# Altium footprint library B-NT_CHIPS.PcbLib: 90 footprints (part 3 of 6)
Each footprint in its own frame and in the unit in brackets; x right, y up, seen from the top. Pads: shape width x height; smd on the part's side, far side on the other; paste and mask are expansions set on the pad; w line width, h text height; cw(c..) or ccw(c..) is an arc to the next point about the centre after c.
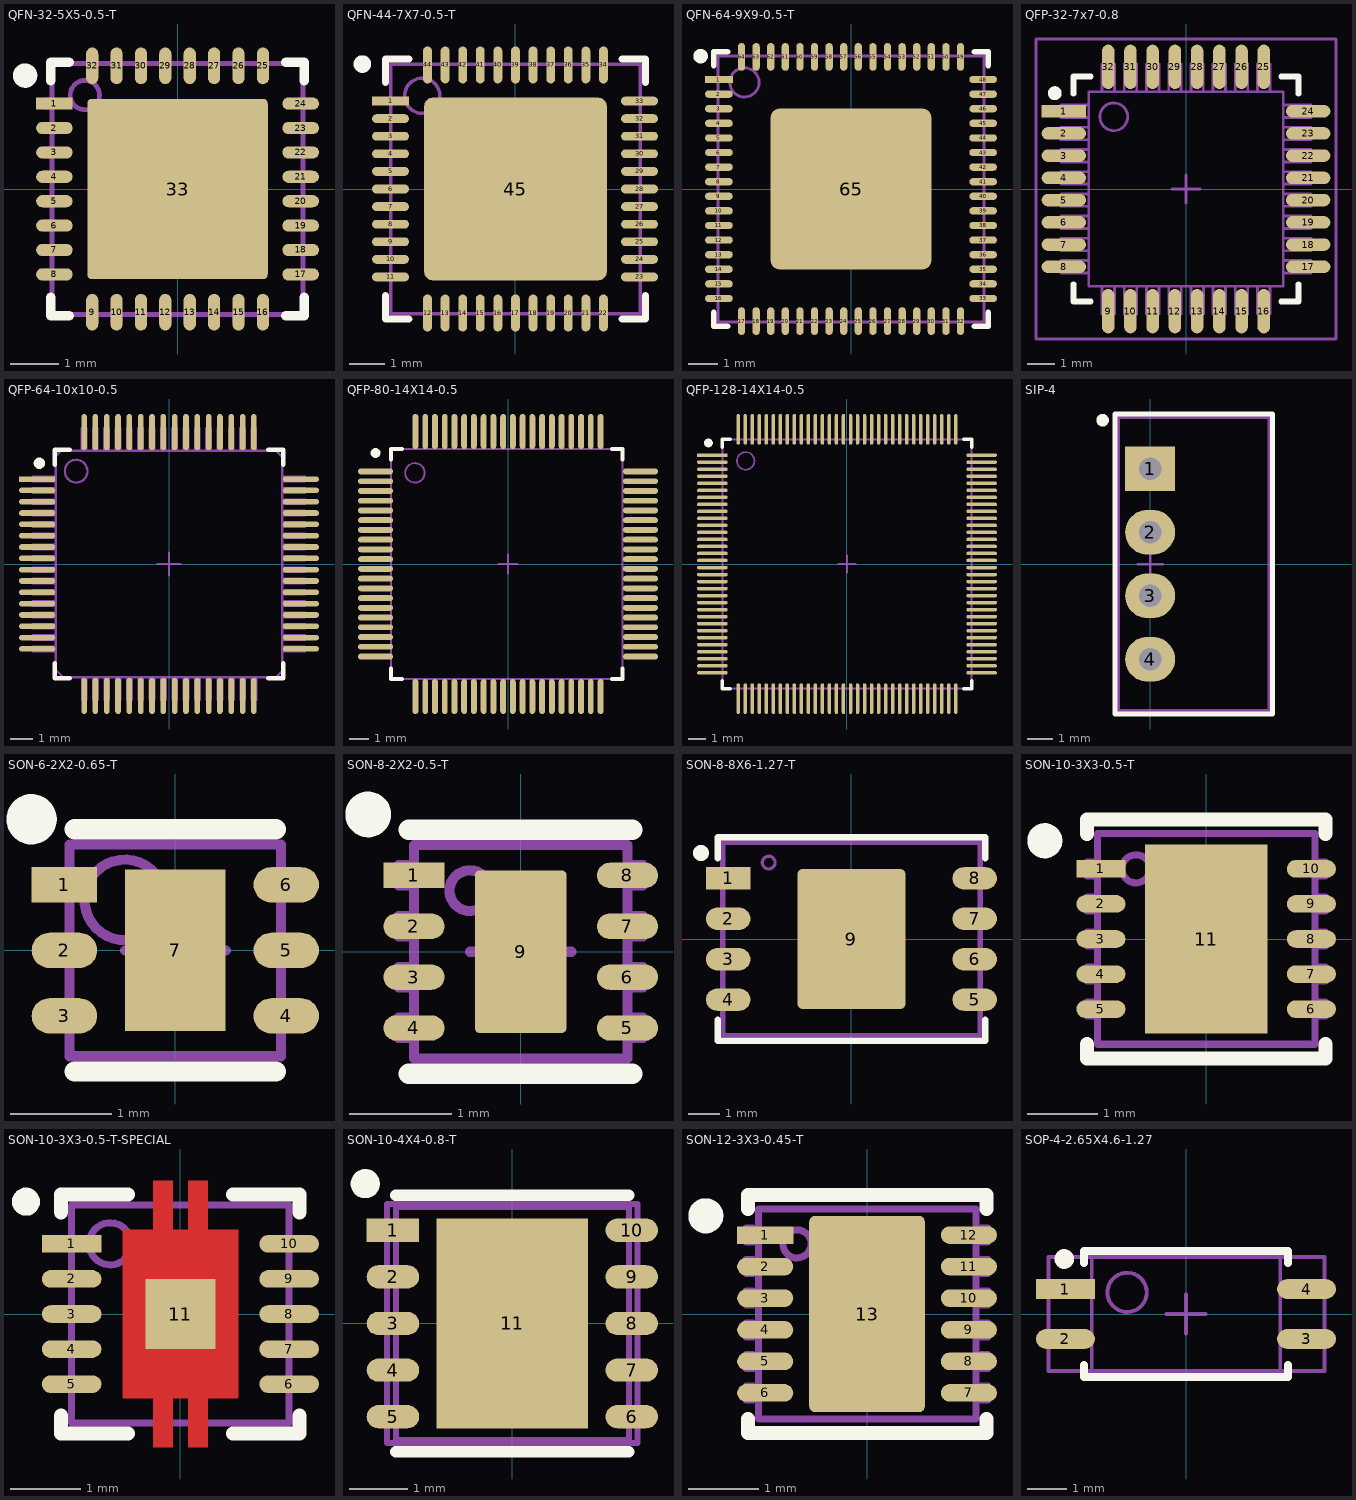
[diagram p2: the footprints below, top view; thin cyan lines are the x and y axes]

## QFN-32-5X5-0.5-T [mm] "QFN, 32-Leads with exposed die pad, Body 5.1x5.1mm (max), Pitch 0.50mm, IPC Medium Density"
height 0.8
pads (33):
  rect 0.75x0.25 smd: 1(-2.525,1.75)
  oval 0.75x0.25 smd: 2(-2.525,1.25) 3(-2.525,0.75) 4(-2.525,0.25) 5(-2.525,-0.25) 6(-2.525,-0.75) 7(-2.525,-1.25) 8(-2.525,-1.75) 17(2.525,-1.75) 18(2.525,-1.25) 19(2.525,-0.75) 20(2.525,-0.25) 21(2.525,0.25) 22(2.525,0.75) 23(2.525,1.25) 24(2.525,1.75)
  oval 0.25x0.75 smd: 9(-1.75,-2.525) 10(-1.25,-2.525) 11(-0.75,-2.525) 12(-0.25,-2.525) 13(0.25,-2.525) 14(0.75,-2.525) 15(1.25,-2.525) 16(1.75,-2.525) 25(1.75,2.525) 26(1.25,2.525) 27(0.75,2.525) 28(0.25,2.525) 29(-0.25,2.525) 30(-0.75,2.525) 31(-1.25,2.525) 32(-1.75,2.525)
  rrect5% 3.7x3.7 smd: 33(0,0)
Top Overlay:
  circle w0.25: c-3.125,2.325 r0.125
  lines w0.2: -2.6,-2.225 -2.6,-2.6 -2.225,-2.6 ; -2.6,2.225 -2.6,2.6 -2.225,2.6 ; 2.225,-2.6 2.6,-2.6 2.6,-2.225 ; 2.225,2.6 2.6,2.6 2.6,2.225
M3 Top Assy:
  circle w0.1: c-1.9,1.925 r0.3
  lines w0.1: -2.575,-1.825 -2.725,-1.825 -2.725,-1.675 -2.575,-1.675 ; -2.575,-1.325 -2.725,-1.325 -2.725,-1.175 -2.575,-1.175 ; -2.575,-0.825 -2.725,-0.825 -2.725,-0.675 -2.575,-0.675 ; -2.575,-0.325 -2.725,-0.325 -2.725,-0.175 -2.575,-0.175 ; -2.575,0.175 -2.725,0.175 -2.725,0.325 -2.575,0.325 ; -2.575,0.675 -2.725,0.675 -2.725,0.825 -2.575,0.825 ; -2.575,1.175 -2.725,1.175 -2.725,1.325 -2.575,1.325 ; -2.575,1.675 -2.725,1.675 -2.725,1.825 -2.575,1.825 ; -1.825,-2.575 -1.825,-2.725 -1.675,-2.725 -1.675,-2.575 ; -1.825,2.575 -1.825,2.725 -1.675,2.725 -1.675,2.575 ; -1.325,-2.575 -1.325,-2.725 -1.175,-2.725 -1.175,-2.575 ; -1.325,2.575 -1.325,2.725 -1.175,2.725 -1.175,2.575 ; -0.825,-2.575 -0.825,-2.725 -0.675,-2.725 -0.675,-2.575 ; -0.825,2.575 -0.825,2.725 -0.675,2.725 -0.675,2.575 ; -0.325,-2.575 -0.325,-2.725 -0.175,-2.725 -0.175,-2.575 ; -0.325,2.575 -0.325,2.725 -0.175,2.725 -0.175,2.575 ; 0.175,-2.575 0.175,-2.725 0.325,-2.725 0.325,-2.575 ; 0.175,2.575 0.175,2.725 0.325,2.725 0.325,2.575 ; 0.675,-2.575 0.675,-2.725 0.825,-2.725 0.825,-2.575 ; 0.675,2.575 0.675,2.725 0.825,2.725 0.825,2.575 ; 1.175,-2.575 1.175,-2.725 1.325,-2.725 1.325,-2.575 ; 1.175,2.575 1.175,2.725 1.325,2.725 1.325,2.575 ; 1.675,-2.575 1.675,-2.725 1.825,-2.725 1.825,-2.575 ; 1.675,2.575 1.675,2.725 1.825,2.725 1.825,2.575 ; 2.575,-1.825 2.725,-1.825 2.725,-1.675 2.575,-1.675 ; 2.575,-1.325 2.725,-1.325 2.725,-1.175 2.575,-1.175 ; 2.575,-0.825 2.725,-0.825 2.725,-0.675 2.575,-0.675 ; 2.575,-0.325 2.725,-0.325 2.725,-0.175 2.575,-0.175 ; 2.575,0.175 2.725,0.175 2.725,0.325 2.575,0.325 ; 2.575,0.675 2.725,0.675 2.725,0.825 2.575,0.825 ; 2.575,1.175 2.725,1.175 2.725,1.325 2.575,1.325 ; 2.575,1.675 2.725,1.675 2.725,1.825 2.575,1.825 ; -2.575,-2.575 2.575,-2.575 2.575,2.575 -2.575,2.575 -2.575,-2.575
M8 Top Brd Anno:
  lines w0.1: -0.5,0 0.5,0 ; 0,-0.5 0,0.5 ; -2.575,-2.575 0,-2.575 2.575,-2.575 2.575,2.575 0,2.575 -2.575,2.575 -2.575,-2.575
3D body "QFN50P500X500X80-33N.STEP": height 0.8, standoff 0, extent -2.545,-2.545 2.545,2.545

## QFN-44-7X7-0.5-T [mm] "QFN, 44-Leads, Body 7,00x7,00mm, Pitch 0,50mm, Thermal Pad 5,20x5,20mm, IPC Medium Density"
height 0.75
pads (45):
  rect 1.05x0.25 smd: 1(-3.55,2.5)
  oval 1.05x0.25 smd: 2(-3.55,2) 3(-3.55,1.5) 4(-3.55,1) 5(-3.55,0.5) 6(-3.55,0) 7(-3.55,-0.5) 8(-3.55,-1) 9(-3.55,-1.5) 10(-3.55,-2) 11(-3.55,-2.5) 23(3.525,-2.5) 24(3.525,-2) 25(3.525,-1.5) 26(3.525,-1) 27(3.525,-0.5) 28(3.525,0) 29(3.525,0.5) 30(3.525,1) 31(3.525,1.5) 32(3.525,2) 33(3.525,2.5)
  oval 0.25x1.05 smd: 12(-2.5,-3.525) 13(-2,-3.525) 14(-1.5,-3.525) 15(-1,-3.525) 16(-0.5,-3.525) 17(0,-3.525) 18(0.5,-3.525) 19(1,-3.525) 20(1.5,-3.525) 21(2,-3.525) 22(2.5,-3.525) 34(2.5,3.525) 35(2,3.525) 36(1.5,3.525) 37(1,3.525) 38(0.5,3.525) 39(0,3.525) 40(-0.5,3.525) 41(-1,3.525) 42(-1.5,3.525) 43(-2,3.525) 44(-2.5,3.525)
  rrect10% 5.2x5.2 smd: 45(0,0)
Top Overlay:
  circle w0.25: c-4.35,3.55 r0.125
  lines w0.2: -3.7,-3.025 -3.7,-3.7 -3.025,-3.7 ; -3.7,3.025 -3.7,3.7 -3.025,3.7 ; 3.025,-3.7 3.7,-3.7 3.7,-3.025 ; 3.025,3.7 3.7,3.7 3.7,3.025
Top Solder:
  rectangle: -2.7,-2.25 2.7,2.225
M3 Top Assy:
  circle w0.1: c-2.65,2.65 r0.5
  lines w0.1: -3.55,-3.55 -3.55,3.55 3.55,3.55 3.55,-3.55 -3.55,-3.55
M8 Top Brd Anno:
  lines w0.1: -0.5,0 0.5,0 ; 0,-0.5 0,0.5 ; -3.55,-3.55 -3.55,3.55 3.55,3.55 3.55,-3.55 -3.55,-3.55
Mechanical 15:
  lines w0.1: -0.5,0 0.5,0 ; 0,-0.5 0,0.5
3D body "QFN50P700X700X100_HS-45N.step": height 1, standoff 0, extent -3.57,-3.57 3.57,3.57

## QFN-64-9X9-0.5-T [mm] "QFN, 64-Leads, Body 9x9mm, Pitch 0.5mm, Thermal Pad 5.5x5.5mm, IPC Low Density"
height 1
pads (65):
  rect 0.95x0.25 smd: 1(-4.525,3.75)
  oval 0.95x0.25 smd: 2(-4.525,3.25) 3(-4.525,2.75) 4(-4.525,2.25) 5(-4.525,1.75) 6(-4.525,1.25) 7(-4.525,0.75) 8(-4.525,0.25) 9(-4.525,-0.25) 10(-4.525,-0.75) 11(-4.525,-1.25) 12(-4.525,-1.75) 13(-4.525,-2.25) 14(-4.525,-2.75) 15(-4.525,-3.25) 16(-4.525,-3.75) 33(4.525,-3.75) 34(4.525,-3.25) 35(4.525,-2.75) 36(4.525,-2.25) 37(4.525,-1.75) 38(4.525,-1.25) 39(4.525,-0.75) 40(4.525,-0.25) 41(4.525,0.25) 42(4.525,0.75) 43(4.525,1.25) 44(4.525,1.75) 45(4.525,2.25) 46(4.525,2.75) 47(4.525,3.25) 48(4.525,3.75)
  oval 0.25x0.95 smd: 17(-3.75,-4.525) 18(-3.25,-4.525) 19(-2.75,-4.525) 20(-2.25,-4.525) 21(-1.75,-4.525) 22(-1.25,-4.525) 23(-0.75,-4.525) 24(-0.25,-4.525) 25(0.25,-4.525) 26(0.75,-4.525) 27(1.25,-4.525) 28(1.75,-4.525) 29(2.25,-4.525) 30(2.75,-4.525) 31(3.25,-4.525) 32(3.75,-4.525) 49(3.75,4.525) 50(3.25,4.525) 51(2.75,4.525) 52(2.25,4.525) 53(1.75,4.525) 54(1.25,4.525) 55(0.75,4.525) 56(0.25,4.525) 57(-0.25,4.525) 58(-0.75,4.525) 59(-1.25,4.525) 60(-1.75,4.525) 61(-2.25,4.525) 62(-2.75,4.525) 63(-3.25,4.525) 64(-3.75,4.525)
  rrect10% 5.5x5.5 smd: 65(0,0)
Top Overlay:
  circle w0.25: c-5.15,4.55 r0.125
  lines w0.2: -4.7,-4.225 -4.7,-4.7 -4.225,-4.7 ; -4.7,4.225 -4.7,4.7 -4.225,4.7 ; 4.225,-4.7 4.7,-4.7 4.7,-4.225 ; 4.225,4.7 4.7,4.7 4.7,4.225
M3 Top Assy:
  circle w0.1: c-3.65,3.65 r0.5
  lines w0.1: -4.55,-4.55 -4.55,4.55 4.55,4.55 4.55,-4.55 -4.55,-4.55
M8 Top Brd Anno:
  lines w0.1: -0.5,0 0.5,0 ; 0,-0.5 0,0.5 ; -4.55,-4.55 4.55,-4.55 4.55,4.55 -4.55,4.55 -4.55,-4.55
3D body "User Library-QFN64-2.STEP": height 0.9, standoff 0, extent -4.52,-4.52 4.52,4.52

## QFP-32-7x7-0.8 [mm] "TQFP, 32-Leads, Body 7,00x7,00mm, Pitch 0,80mm, IPC Medium Density"
height 1.6
pads (32):
  rect 1.6x0.45 smd: 1(-4.4,2.8)
  oval 1.6x0.45 smd: 2(-4.4,2) 3(-4.4,1.2) 4(-4.4,0.4) 5(-4.4,-0.4) 6(-4.4,-1.2) 7(-4.4,-2) 8(-4.4,-2.8) 17(4.4,-2.8) 18(4.4,-2) 19(4.4,-1.2) 20(4.4,-0.4) 21(4.4,0.4) 22(4.4,1.2) 23(4.4,2) 24(4.4,2.8)
  oval 0.45x1.6 smd: 9(-2.8,-4.4) 10(-2,-4.4) 11(-1.2,-4.4) 12(-0.4,-4.4) 13(0.4,-4.4) 14(1.2,-4.4) 15(2,-4.4) 16(2.8,-4.4) 25(2.8,4.4) 26(2,4.4) 27(1.2,4.4) 28(0.4,4.4) 29(-0.4,4.4) 30(-1.2,4.4) 31(-2,4.4) 32(-2.8,4.4)
Top Overlay:
  circle w0.25: c-4.725,3.45 r0.125
  lines w0.2: -4.05,-3.425 -4.05,-4.05 -3.425,-4.05 ; -4.05,3.425 -4.05,4.05 -3.425,4.05 ; 3.425,-4.05 4.05,-4.05 4.05,-3.425 ; 3.425,4.05 4.05,4.05 4.05,3.425
M3 Top Assy:
  circle w0.1: c-2.6,2.6 r0.5
  lines w0.1: -3.5,-3.025 -4.5,-3.025 -4.5,-2.8 -4.5,-2.575 -3.5,-2.575 ; -3.5,-2.225 -4.5,-2.225 -4.5,-2 -4.5,-1.775 -3.5,-1.775 ; -3.5,-1.425 -4.5,-1.425 -4.5,-1.2 -4.5,-0.975 -3.5,-0.975 ; -3.5,-0.625 -4.5,-0.625 -4.5,-0.4 -4.5,-0.175 -3.5,-0.175 ; -3.5,0.175 -4.5,0.175 -4.5,0.4 -4.5,0.625 -3.5,0.625 ; -3.5,0.975 -4.5,0.975 -4.5,1.2 -4.5,1.425 -3.5,1.425 ; -3.5,1.775 -4.5,1.775 -4.5,2 -4.5,2.225 -3.5,2.225 ; -3.5,2.575 -4.5,2.575 -4.5,2.8 -4.5,3.025 -3.5,3.025 ; -3.025,-3.5 -3.025,-4.5 -2.8,-4.5 -2.575,-4.5 -2.575,-3.5 ; -3.025,3.5 -3.025,4.5 -2.8,4.5 -2.575,4.5 -2.575,3.5 ; -2.225,-3.5 -2.225,-4.5 -2,-4.5 -1.775,-4.5 -1.775,-3.5 ; -2.225,3.5 -2.225,4.5 -2,4.5 -1.775,4.5 -1.775,3.5 ; -1.425,-3.5 -1.425,-4.5 -1.2,-4.5 -0.975,-4.5 -0.975,-3.5 ; -1.425,3.5 -1.425,4.5 -1.2,4.5 -0.975,4.5 -0.975,3.5 ; -0.625,-3.5 -0.625,-4.5 -0.4,-4.5 -0.175,-4.5 -0.175,-3.5 ; -0.625,3.5 -0.625,4.5 -0.4,4.5 -0.175,4.5 -0.175,3.5 ; 0.175,-3.5 0.175,-4.5 0.4,-4.5 0.625,-4.5 0.625,-3.5 ; 0.175,3.5 0.175,4.5 0.4,4.5 0.625,4.5 0.625,3.5 ; 0.975,-3.5 0.975,-4.5 1.2,-4.5 1.425,-4.5 1.425,-3.5 ; 0.975,3.5 0.975,4.5 1.2,4.5 1.425,4.5 1.425,3.5 ; 1.775,-3.5 1.775,-4.5 2,-4.5 2.225,-4.5 2.225,-3.5 ; 1.775,3.5 1.775,4.5 2,4.5 2.225,4.5 2.225,3.5 ; 2.575,-3.5 2.575,-4.5 2.8,-4.5 3.025,-4.5 3.025,-3.5 ; 2.575,3.5 2.575,4.5 2.8,4.5 3.025,4.5 3.025,3.5 ; 3.5,-3.025 4.5,-3.025 4.5,-2.8 4.5,-2.575 3.5,-2.575 ; 3.5,-2.225 4.5,-2.225 4.5,-2 4.5,-1.775 3.5,-1.775 ; 3.5,-1.425 4.5,-1.425 4.5,-1.2 4.5,-0.975 3.5,-0.975 ; 3.5,-0.625 4.5,-0.625 4.5,-0.4 4.5,-0.175 3.5,-0.175 ; 3.5,0.175 4.5,0.175 4.5,0.4 4.5,0.625 3.5,0.625 ; 3.5,0.975 4.5,0.975 4.5,1.2 4.5,1.425 3.5,1.425 ; 3.5,1.775 4.5,1.775 4.5,2 4.5,2.225 3.5,2.225 ; 3.5,2.575 4.5,2.575 4.5,2.8 4.5,3.025 3.5,3.025 ; -3.5,-3.5 3.5,-3.5 3.5,3.5 -3.5,3.5 -3.5,-3.5
M8 Top Brd Anno:
  lines w0.1: -0.5,0 0.5,0 ; 0,-0.5 0,0.5 ; -5.4,-5.4 -5.4,5.4 5.4,5.4 5.4,-5.4 -5.4,-5.4
3D body "User Library-PQFP_32_P0_8.STEP": height 1.6, standoff -0.05, extent -4.5,-4.5 4.5,4.5

## QFP-64-10x10-0.5 [mm] "LQFP, 64-Leads, Body 10x10mm, Pitch 0.5mm"
height 1.6
pads (64):
  rect 1.6x0.25 smd: 1(-5.825,3.75)
  oval 1.6x0.25 smd: 2(-5.825,3.25) 3(-5.825,2.75) 4(-5.825,2.25) 5(-5.825,1.75) 6(-5.825,1.25) 7(-5.825,0.75) 8(-5.825,0.25) 9(-5.825,-0.25) 10(-5.825,-0.75) 11(-5.825,-1.25) 12(-5.825,-1.75) 13(-5.825,-2.25) 14(-5.825,-2.75) 15(-5.825,-3.25) 16(-5.825,-3.75) 33(5.825,-3.75) 34(5.825,-3.25) 35(5.825,-2.75) 36(5.825,-2.25) 37(5.825,-1.75) 38(5.825,-1.25) 39(5.825,-0.75) 40(5.825,-0.25) 41(5.825,0.25) 42(5.825,0.75) 43(5.825,1.25) 44(5.825,1.75) 45(5.825,2.25) 46(5.825,2.75) 47(5.825,3.25) 48(5.825,3.75)
  oval 0.25x1.6 smd: 17(-3.75,-5.825) 18(-3.25,-5.825) 19(-2.75,-5.825) 20(-2.25,-5.825) 21(-1.75,-5.825) 22(-1.25,-5.825) 23(-0.75,-5.825) 24(-0.25,-5.825) 25(0.25,-5.825) 26(0.75,-5.825) 27(1.25,-5.825) 28(1.75,-5.825) 29(2.25,-5.825) 30(2.75,-5.825) 31(3.25,-5.825) 32(3.75,-5.825) 49(3.75,5.825) 50(3.25,5.825) 51(2.75,5.825) 52(2.25,5.825) 53(1.75,5.825) 54(1.25,5.825) 55(0.75,5.825) 56(0.25,5.825) 57(-0.25,5.825) 58(-0.75,5.825) 59(-1.25,5.825) 60(-1.75,5.825) 61(-2.25,5.825) 62(-2.75,5.825) 63(-3.25,5.825) 64(-3.75,5.825)
Top Overlay:
  circle w0.25: c-5.725,4.45 r0.125
  lines w0.2: -5.05,-4.375 -5.05,-5.05 -4.375,-5.05 ; -5.05,4.375 -5.05,5.05 -4.375,5.05 ; 4.375,-5.05 5.05,-5.05 5.05,-4.375 ; 4.375,5.05 5.05,5.05 5.05,4.375
M3 Top Assy:
  drawing of 201 lines, arcs and shapes, not listed
M8 Top Brd Anno:
  lines w0.1: -0.5,0 0.5,0 ; 0,-0.5 0,0.5 ; -5,-5 -5,5 0,5 5,5 5,-5 0,-5 -5,-5
3D body "PM0064A.stp": height 1.5, standoff 0, extent -6.011,-6.011 6.011,6.011

## QFP-80-14X14-0.5 [mm] "TQFN, 80-Leads, Body 14x14mm, Pitch 0.5mm"
height 1
pads (80):
  oval 1.8x0.3 smd: 1(-6.8,4.75) 2(-6.8,4.25) 3(-6.8,3.75) 4(-6.8,3.25) 5(-6.8,2.75) 6(-6.8,2.25) 7(-6.8,1.75) 8(-6.8,1.25) 9(-6.8,0.75) 10(-6.8,0.25) 11(-6.8,-0.25) 12(-6.8,-0.75) 13(-6.8,-1.25) 14(-6.8,-1.75) 15(-6.8,-2.25) 16(-6.8,-2.75) 17(-6.8,-3.25) 18(-6.8,-3.75) 19(-6.8,-4.25) 20(-6.8,-4.75) 41(6.8,-4.75) 42(6.8,-4.25) 43(6.8,-3.75) 44(6.8,-3.25) 45(6.8,-2.75) 46(6.8,-2.25) 47(6.8,-1.75) 48(6.8,-1.25) 49(6.8,-0.75) 50(6.8,-0.25) 51(6.8,0.25) 52(6.8,0.75) 53(6.8,1.25) 54(6.8,1.75) 55(6.8,2.25) 56(6.8,2.75) 57(6.8,3.25) 58(6.8,3.75) 59(6.8,4.25) 60(6.8,4.75)
  oval 0.3x1.8 smd: 21(-4.75,-6.8) 22(-4.25,-6.8) 23(-3.75,-6.8) 24(-3.25,-6.8) 25(-2.75,-6.8) 26(-2.25,-6.8) 27(-1.75,-6.8) 28(-1.25,-6.8) 29(-0.75,-6.8) 30(-0.25,-6.8) 31(0.25,-6.8) 32(0.75,-6.8) 33(1.25,-6.8) 34(1.75,-6.8) 35(2.25,-6.8) 36(2.75,-6.8) 37(3.25,-6.8) 38(3.75,-6.8) 39(4.25,-6.8) 40(4.75,-6.8) 61(4.75,6.8) 62(4.25,6.8) 63(3.75,6.8) 64(3.25,6.8) 65(2.75,6.8) 66(2.25,6.8) 67(1.75,6.8) 68(1.25,6.8) 69(0.75,6.8) 70(0.25,6.8) 71(-0.25,6.8) 72(-0.75,6.8) 73(-1.25,6.8) 74(-1.75,6.8) 75(-2.25,6.8) 76(-2.75,6.8) 77(-3.25,6.8) 78(-3.75,6.8) 79(-4.25,6.8) 80(-4.75,6.8)
Top Overlay:
  circle w0.25: c-6.8,5.7 r0.125
  lines w0.2: -6,5.35 -6,5.9 -5.45,5.9 ; -6,-5.35 -6,-5.9 -5.45,-5.9 ; 5.325,-5.9 5.875,-5.9 5.875,-5.35 ; 5.325,5.9 5.875,5.9 5.875,5.35
M3 Top Assy:
  circle w0.1: c-4.775,4.675 r0.5
  lines w0.1: -6,-5.9 -6,5.9 5.875,5.9 5.875,-5.9 -6,-5.9
M8 Top Brd Anno:
  lines w0.1: -0.5,0 0.5,0 ; 0,-0.5 0,0.5 ; -6,-5.9 -6,5.9 5.875,5.9 5.875,-5.9 -6,-5.9
3D body "User Library-QFP50P1400X1400X160-80N.STEP": height 1.6, standoff 0, extent -7.1,-7.1 7.1,7.1

## QFP-128-14X14-0.5 [mm] "TQFP, 128-Leads, Body 14x14mm, Pitch 0.5mm"
height 1
pads (128):
  rect 1.75x0.2 smd: 1(-7.675,6.2)
  oval 1.75x0.2 smd: 2(-7.675,5.8) 3(-7.675,5.4) 4(-7.675,5) 5(-7.675,4.6) 6(-7.675,4.2) 7(-7.675,3.8) 8(-7.675,3.4) 9(-7.675,3) 10(-7.675,2.6) 11(-7.675,2.2) 12(-7.675,1.8) 13(-7.675,1.4) 14(-7.675,1) 15(-7.675,0.6) 16(-7.675,0.2) 17(-7.675,-0.2) 18(-7.675,-0.6) 19(-7.675,-1) 20(-7.675,-1.4) 21(-7.675,-1.8) 22(-7.675,-2.2) 23(-7.675,-2.6) 24(-7.675,-3) 25(-7.675,-3.4) 26(-7.675,-3.8) 27(-7.675,-4.2) 28(-7.675,-4.6) 29(-7.675,-5) 30(-7.675,-5.4) 31(-7.675,-5.8) 32(-7.675,-6.2) 65(7.675,-6.2) 66(7.675,-5.8) 67(7.675,-5.4) 68(7.675,-5) 69(7.675,-4.6) 70(7.675,-4.2) 71(7.675,-3.8) 72(7.675,-3.4) 73(7.675,-3) 74(7.675,-2.6) 75(7.675,-2.2) 76(7.675,-1.8) 77(7.675,-1.4) 78(7.675,-1) 79(7.675,-0.6) 80(7.675,-0.2) 81(7.675,0.2) 82(7.675,0.6) 83(7.675,1) 84(7.675,1.4) 85(7.675,1.8) 86(7.675,2.2) 87(7.675,2.6) 88(7.675,3) 89(7.675,3.4) 90(7.675,3.8) 91(7.675,4.2) 92(7.675,4.6) 93(7.675,5) 94(7.675,5.4) 95(7.675,5.8) 96(7.675,6.2)
  oval 0.2x1.75 smd: 33(-6.2,-7.675) 34(-5.8,-7.675) 35(-5.4,-7.675) 36(-5,-7.675) 37(-4.6,-7.675) 38(-4.2,-7.675) 39(-3.8,-7.675) 40(-3.4,-7.675) 41(-3,-7.675) 42(-2.6,-7.675) 43(-2.2,-7.675) 44(-1.8,-7.675) 45(-1.4,-7.675) 46(-1,-7.675) 47(-0.6,-7.675) 48(-0.2,-7.675) 49(0.2,-7.675) 50(0.6,-7.675) 51(1,-7.675) 52(1.4,-7.675) 53(1.8,-7.675) 54(2.2,-7.675) 55(2.6,-7.675) 56(3,-7.675) 57(3.4,-7.675) 58(3.8,-7.675) 59(4.2,-7.675) 60(4.6,-7.675) 61(5,-7.675) 62(5.4,-7.675) 63(5.8,-7.675) 64(6.2,-7.675) 97(6.2,7.675) 98(5.8,7.675) 99(5.4,7.675) 100(5,7.675) 101(4.6,7.675) 102(4.2,7.675) 103(3.8,7.675) 104(3.4,7.675) 105(3,7.675) 106(2.6,7.675) 107(2.2,7.675) 108(1.8,7.675) 109(1.4,7.675) 110(1,7.675) 111(0.6,7.675) 112(0.2,7.675) 113(-0.2,7.675) 114(-0.6,7.675) 115(-1,7.675) 116(-1.4,7.675) 117(-1.8,7.675) 118(-2.2,7.675) 119(-2.6,7.675) 120(-3,7.675) 121(-3.4,7.675) 122(-3.8,7.675) 123(-4.2,7.675) 124(-4.6,7.675) 125(-5,7.675) 126(-5.4,7.675) 127(-5.8,7.675) 128(-6.2,7.675)
Top Overlay:
  circle w0.25: c-7.9,6.9 r0.125
  lines w0.2: -7.1,-6.65 -7.1,-7.1 -6.65,-7.1 ; -7.1,6.65 -7.1,7.1 -6.65,7.1 ; 6.65,-7.1 7.1,-7.1 7.1,-6.65 ; 6.65,7.1 7.1,7.1 7.1,6.65
M3 Top Assy:
  circle w0.1: c-5.775,5.875 r0.5
  lines w0.1: -7.1,-7.1 7.1,-7.1 7.1,7.1 -7.1,7.1 -7.1,-7.1
M8 Top Brd Anno:
  lines w0.1: -0.5,0 0.5,0 ; 0,-0.5 0,0.5 ; -7.1,-7.1 7.1,-7.1 7.1,7.1 -7.1,7.1 -7.1,-7.1
3D body "User Library-TQFP128.step": height 1.1, standoff 0, extent -8.009,-8.009 8.009,8.009

## SIP-4 [mm] "4-SIP Module, 0.45\" L x 0.24\" W x 0.39\" H (11.5mm x 6.0mm x 10.0mm)"
pads (4):
  rect 2x1.8 hole 0.9: 1(0,3.81)
  oval 2x1.8 hole 0.9: 2(0,1.27) 3(0,-1.27) 4(0,-3.81)
Top Overlay:
  circle w0.25: c-1.9,5.75 r0.125
  lines w0.2: -1.4,-6 4.9,-6 4.9,6 -1.4,6 -1.4,-6
M3 Top Assy:
  lines w0.1: -1.25,-5.85 4.75,-5.85 4.75,5.85 -1.25,5.85 -1.25,-5.85
M8 Top Brd Anno:
  lines w0.1: -0.5,0 0.5,0 ; 0,-0.5 0,0.5 ; -1.3,-5.9 4.8,-5.9 4.8,5.9 -1.3,5.9 -1.3,-5.9
3D body "User Library-4-Lead SIP_AM1S-1205SZ_Aimtec_DC-DC_Converter_1_Watt.step": height 10.15, standoff -3.05, extent -1.25,-5.834 4.75,5.85

## SON-6-2X2-0.65-T [mm] "SON, 6-Leads, Body 2,00x2,00mm, Pitch 0,65mm, Thermal Pad 1,60x0,89mm, IPC Medium Density"
height 0.8
pads (7):
  rect 0.65x0.35 smd: 1(-1.1,0.65)
  oval 0.65x0.35 smd: 2(-1.1,0) 3(-1.1,-0.65) 4(1.1,-0.65) 5(1.1,0) 6(1.1,0.65)
  rect 1x1.6 smd: 7(0,0)
Top Overlay:
  circle w0.25: c-1.425,1.3 r0.125
  lines w0.2: -1,-1.2 1,-1.2 ; -1,1.2 1,1.2
M3 Top Assy:
  circle w0.1: c-0.5,0.5 r0.4
  lines w0.1: -1.05,-1.05 1.05,-1.05 1.05,1.05 -1.05,1.05 -1.05,-1.05
M8 Top Brd Anno:
  lines w0.05: -1.05,-1.05 1.05,-1.05 1.05,1.05 -1.05,1.05 -1.05,-1.05
  lines w0.1: -0.5,0 0.5,0 ; 0,-0.5 0,0.5
3D body "SON65P200X80_HS-7N.step": height 0.8, standoff 0, extent -1.1,-1.05 1.1,1.05

## SON-8-2X2-0.5-T [mm]
pads (9):
  rect 0.6x0.25 smd: 1(-1.05,0.75)
  oval 0.6x0.25 smd: 2(-1.05,0.25) 3(-1.05,-0.25) 4(-1.05,-0.75) 5(1.05,-0.75) 6(1.05,-0.25) 7(1.05,0.25) 8(1.05,0.75)
  rrect10% 0.9x1.6 smd: 9(0,0)
Top Overlay:
  circle w0.25: c-1.5,1.35 r0.1
  lines w0.2: -1.1,-1.2 1.1,-1.2 ; -1.1,1.2 1.1,1.2
M3 Top Assy:
  circle w0.1: c-0.5,0.6 r0.2
  lines w0.1: -1.1,-0.85 -1.2,-0.85 -1.2,-0.65 -1.1,-0.65 ; -1.1,-0.35 -1.2,-0.35 -1.2,-0.15 -1.1,-0.15 ; -1.1,0.15 -1.2,0.15 -1.2,0.35 -1.1,0.35 ; -1.1,0.65 -1.2,0.65 -1.2,0.85 -1.1,0.85 ; 1.1,-0.85 1.2,-0.85 1.2,-0.65 1.1,-0.65 ; 1.1,-0.35 1.2,-0.35 1.2,-0.15 1.1,-0.15 ; 1.1,0.15 1.2,0.15 1.2,0.35 1.1,0.35 ; 1.1,0.65 1.2,0.65 1.2,0.85 1.1,0.85 ; -1.05,-1.05 -1.05,1.05 1.05,1.05 1.05,-1.05 -1.05,-1.05
M8 Top Brd Anno:
  lines w0.1: -0.5,0 0.5,0 ; 0,-0.5 0,0.5 ; -1.05,-1.05 -1.05,1.05 1.05,1.05 1.05,-1.05 -1.05,-1.05
3D body "SON8-2x2mm.STEP": height 0.85, standoff 0, extent -1.1,-1.05 1.1,1.05

## SON-8-8X6-1.27-T [mm]
height 0.8
pads (9):
  rect 1.4x0.7 smd: 1(-3.87,1.905)
  oval 1.4x0.7 smd: 2(-3.87,0.635) 3(-3.87,-0.635) 4(-3.87,-1.905) 5(3.87,-1.905) 6(3.87,-0.635) 7(3.87,0.635) 8(3.87,1.905)
  rrect10% 3.4x4.4 smd: 9(0,0)
Top Overlay:
  circle w0.25: c-4.725,2.7 r0.125
  lines w0.2: -4.2,-2.53 -4.2,-3.2 4.2,-3.2 4.2,-2.53 ; -4.2,2.53 -4.2,3.2 4.2,3.2 4.2,2.53
M3 Top Assy:
  circle w0.1: c-2.6,2.4 r0.2
  lines w0.1: -4,-3 -4,3 4,3 4,-3 -4,-3
M8 Top Brd Anno:
  lines w0.1: -0.5,0 0.5,0 ; 0,-0.5 0,0.5 ; -4.075,-3.025 -4.075,3.075 4.075,3.075 4.075,-3.025 -4.075,-3.025
3D body "SON127P800X75_HS-9N.step": height 0.75, standoff 0, extent -4.07,-3.05 4.07,3.05

## SON-10-3X3-0.5-T [mm]
height 0.8
pads (11):
  rect 0.7x0.25 smd: 1(-1.5,1)
  oval 0.7x0.25 smd: 2(-1.5,0.5) 3(-1.5,0) 4(-1.5,-0.5) 5(-1.5,-1) 6(1.5,-1) 7(1.5,-0.5) 8(1.5,0) 9(1.5,0.5) 10(1.5,1)
  rect 1.75x2.7 smd: 11(0,0)
Top Overlay:
  circle w0.25: c-2.3,1.4 r0.125
  lines w0.2: -1.7,-1.5 -1.7,-1.7 1.7,-1.7 1.7,-1.5 ; -1.7,1.5 -1.7,1.7 1.7,1.7 1.7,1.5
M3 Top Assy:
  circle w0.1: c-1,1 r0.2
  lines w0.1: -1.6,-1.1 -1.7,-1.1 -1.7,-0.9 -1.6,-0.9 ; -1.6,-0.6 -1.7,-0.6 -1.7,-0.4 -1.6,-0.4 ; -1.6,-0.1 -1.7,-0.1 -1.7,0.1 -1.6,0.1 ; -1.6,0.4 -1.7,0.4 -1.7,0.6 -1.6,0.6 ; -1.6,0.9 -1.7,0.9 -1.7,1.1 -1.6,1.1 ; 1.6,-1.1 1.7,-1.1 1.7,-0.9 1.6,-0.9 ; 1.6,-0.6 1.7,-0.6 1.7,-0.4 1.6,-0.4 ; 1.6,-0.1 1.7,-0.1 1.7,0.1 1.6,0.1 ; 1.6,0.4 1.7,0.4 1.7,0.6 1.6,0.6 ; 1.6,0.9 1.7,0.9 1.7,1.1 1.6,1.1 ; -1.55,-1.5 1.55,-1.5 1.55,1.5 -1.55,1.5 -1.55,-1.5
M8 Top Brd Anno:
  lines w0.1: -0.5,0 0.5,0 ; 0,-0.5 0,0.5 ; -1.55,-1.5 1.55,-1.5 1.55,1.5 -1.55,1.5 -1.55,-1.5
3D body "RT6150B(1).STEP": height 0.85, standoff 0, extent -1.55,-1.5 1.55,1.5

## SON-10-3X3-0.5-T-SPECIAL [mm]
height 0.75
pads (11):
  rect 0.85x0.25 smd: 1(-1.55,1)
  oval 0.85x0.25 smd: 2(-1.55,0.5) 3(-1.55,0) 4(-1.55,-0.5) 5(-1.55,-1) 6(1.55,-1) 7(1.55,-0.5) 8(1.55,0) 9(1.55,0.5) 10(1.55,1)
  rect 1x1 smd: 11(0,0)
Top Layer:
  region: -0.825,1.2 -0.39,1.2 -0.39,1.9 -0.11,1.9 -0.11,1.2 0.11,1.2 0.11,1.9 0.39,1.9 0.39,1.2 0.825,1.2 0.825,-1.2 0.39,-1.2 0.39,-1.9 0.11,-1.9 0.11,-1.2 -0.11,-1.2 -0.11,-1.9 -0.39,-1.9 -0.39,-1.2 -0.825,-1.2
Top Overlay:
  circle w0.2: c-2.2,1.6 r0.1
  lines w0.2: -1.7,-1.45 -1.7,-1.7 -0.75,-1.7 ; -1.7,1.45 -1.7,1.7 -0.75,1.7 ; 0.75,-1.7 1.7,-1.7 1.7,-1.45 ; 0.75,1.7 1.7,1.7 1.7,1.45
M3 Top Assy:
  circle w0.1: c-1,1 r0.3
  lines w0.1: -1.55,-1.55 -1.55,1.55 1.55,1.55 1.55,-1.55 -1.55,-1.55
M8 Top Brd Anno:
  lines w0.1: -0.5,0 0.5,0 ; 0,-0.5 0,0.5 ; -1.55,-1.55 -1.55,0.825 -1.55,1.55 1.55,1.55 1.55,-1.55 -1.55,-1.55
3D body "RT6150B(1).STEP": height 0.85, standoff 0, extent -1.55,-1.5 1.55,1.5

## SON-10-4X4-0.8-T [mm]
height 0.8
pads (11):
  rect 0.9x0.4 smd: 1(-2.05,1.6)
  oval 0.9x0.4 smd: 2(-2.05,0.8) 3(-2.05,0) 4(-2.05,-0.8) 5(-2.05,-1.6) 6(2.05,-1.6) 7(2.05,-0.8) 8(2.05,0) 9(2.05,0.8) 10(2.05,1.6)
  rect 2.6x3.6 smd: 11(0,0)
Top Overlay:
  circle w0.25: c-2.525,2.4 r0.125
  lines w0.2: -2,-2.2 2,-2.2 ; -2,2.2 2,2.2
M3 Top Assy:
  circle w0.1: c-1,1.5 r0.2
  lines w0.1: -2,-2 2,-2 2,2 -2,2 -2,-2
M8 Top Brd Anno:
  lines w0.1: -0.5,0 0.5,0 ; 0,-0.5 0,0.5 ; -2.15,-2.05 2.15,-2.05 2.15,2.05 -2.15,2.05 -2.15,-2.05
3D body "SON80P400X80_HS-11N.step": height 0.8, standoff 0, extent -2.15,-2.05 2.15,2.05

## SON-12-3X3-0.45-T [mm]
height 0.8
pads (13):
  rect 0.8x0.25 smd: 1(-1.452,1.125)
  oval 0.8x0.25 smd: 2(-1.452,0.675) 3(-1.452,0.225) 4(-1.452,-0.225) 5(-1.452,-0.675) 6(-1.452,-1.125) 7(1.452,-1.125) 8(1.452,-0.675) 9(1.452,-0.225) 10(1.452,0.225) 11(1.452,0.675) 12(1.452,1.125)
  rrect10% 1.65x2.8 smd: 13(0,0)
Top Overlay:
  circle w0.25: c-2.3,1.4 r0.125
  lines w0.2: -1.7,-1.5 -1.7,-1.7 1.7,-1.7 1.7,-1.5 ; -1.7,1.5 -1.7,1.7 1.7,1.7 1.7,1.5
M3 Top Assy:
  circle w0.1: c-1,1 r0.2
  lines w0.1: -1.625,-1.225 -1.725,-1.225 -1.725,-1.025 -1.625,-1.025 ; -1.625,-0.775 -1.725,-0.775 -1.725,-0.575 -1.625,-0.575 ; -1.625,-0.325 -1.725,-0.325 -1.725,-0.125 -1.625,-0.125 ; -1.625,0.125 -1.725,0.125 -1.725,0.325 -1.625,0.325 ; -1.625,0.575 -1.725,0.575 -1.725,0.775 -1.625,0.775 ; -1.625,1.025 -1.725,1.025 -1.725,1.225 -1.625,1.225 ; 1.625,-1.225 1.725,-1.225 1.725,-1.025 1.625,-1.025 ; 1.625,-0.775 1.725,-0.775 1.725,-0.575 1.625,-0.575 ; 1.625,-0.325 1.725,-0.325 1.725,-0.125 1.625,-0.125 ; 1.625,0.125 1.725,0.125 1.725,0.325 1.625,0.325 ; 1.625,0.575 1.725,0.575 1.725,0.775 1.625,0.775 ; 1.625,1.025 1.725,1.025 1.725,1.225 1.625,1.225 ; -1.55,-1.5 -1.55,1.5 1.55,1.5 1.55,-1.5 -1.55,-1.5
M8 Top Brd Anno:
  lines w0.1: -0.5,0 0.5,0 ; 0,-0.5 0,0.5 ; -1.55,-1.5 -1.55,1.5 1.55,1.5 1.55,-1.5 -1.55,-1.5
3D body "User Library-DFN12(3x3)-1.STEP": height 0.81, standoff 0.05, extent -1.501,-1.5 1.501,1.5

## SOP-4-2.65X4.6-1.27 [mm] "SOIC, 4-Leads, Body 2,65x4,60mm, Pitch 1,27mm, IPC Medium Density"
height 2.1
pads (4):
  rect 1.5x0.5 smd: 1(-3.07,0.635)
  oval 1.5x0.5 smd: 2(-3.07,-0.635) 3(3.07,-0.635) 4(3.07,0.635)
Top Overlay:
  circle w0.25: c-3.1,1.4 r0.125
  lines w0.2: -2.6,-1.3 -2.6,-1.6 2.6,-1.6 2.6,-1.3 ; -2.6,1.3 -2.6,1.6 2.6,1.6 2.6,1.3
M3 Top Assy:
  circle w0.1: c-1.5,0.55 r0.5
  lines w0.1: -2.4,-1.45 -2.4,1.45 2.4,1.45 2.4,-1.45 -2.4,-1.45
M8 Top Brd Anno:
  lines w0.1: -0.5,0 0.5,0 ; 0,-0.5 0,0.5 ; -3.5,-1.45 -3.5,1.45 3.525,1.45 3.525,-1.45 -3.5,-1.45
3D body "SOIC127P700X210-4N.step": height 2.1, standoff 0, extent -3.5,-1.45 3.5,1.45